# Altium footprint library con-samtec.PCBLIB: 805 footprints (part 34 of 55)
Each footprint in its own frame and in the unit in brackets; x right, y up, seen from the top. Pads: shape width x height; smd on the part's side, far side on the other; paste and mask are expansions set on the pad; w line width, h text height; cw(c..) or ccw(c..) is an arc to the next point about the centre after c.
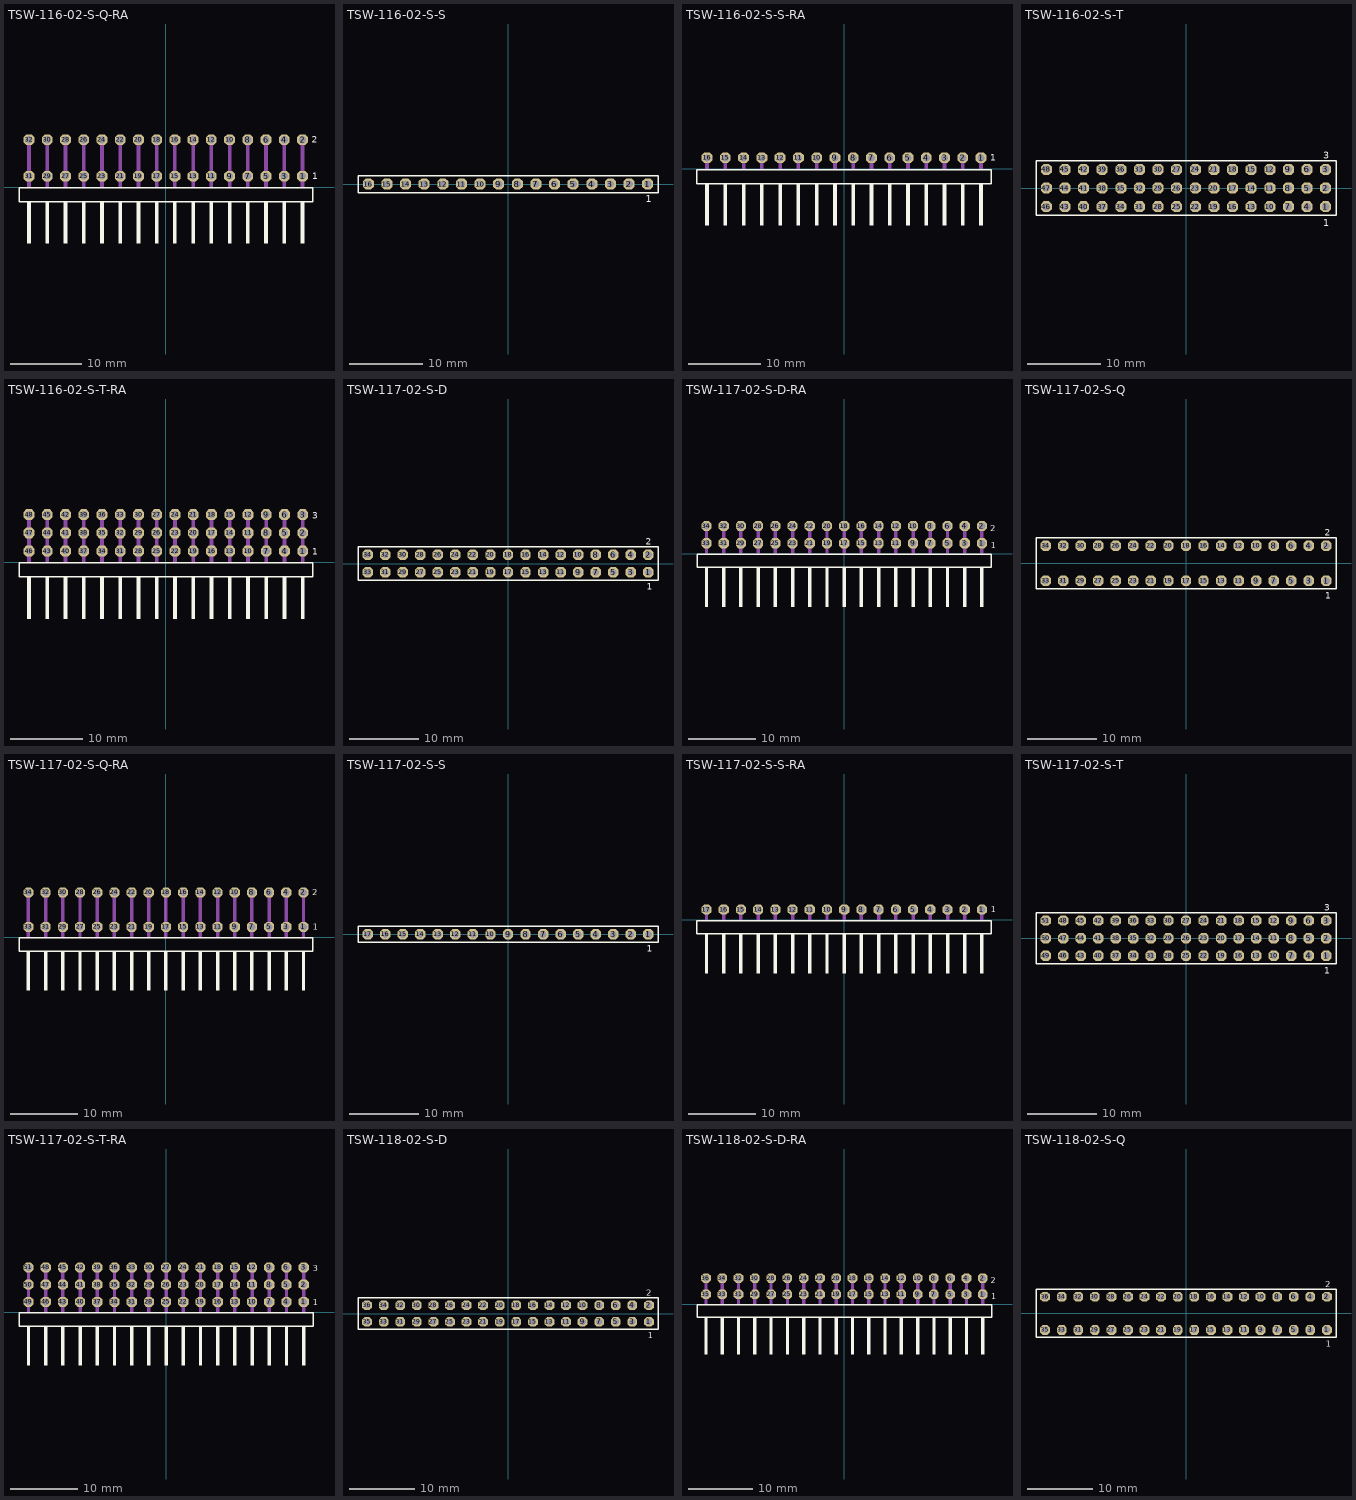
[diagram p33: the footprints below, top view; thin cyan lines are the x and y axes]

## TSW-116-02-S-Q-RA [mil]
pads (32):
  oct 59.06x59.06 hole 39.37: 1(750,60) 2(750,260) 3(650,60) 4(650,260) 5(550,60) 6(550,260) 7(450,60) 8(450,260) 9(350,60) 10(350,260) 11(250,60) 12(250,260) 13(150,60) 14(150,260) 15(50,60) 16(50,260) 17(-50,60) 18(-50,260) 19(-150,60) 20(-150,260) 21(-250,60) 22(-250,260) 23(-350,60) 24(-350,260) 25(-450,60) 26(-450,260) 27(-550,60) 28(-550,260) 29(-650,60) 30(-650,260) 31(-750,60) 32(-750,260)
Top Overlay:
  rectangle: -760,-310.63 -740,-80.32
  rectangle: -660,-310.63 -640,-80.32
  rectangle: -560,-310.63 -540,-80.32
  rectangle: -460,-310.63 -440,-80.32
  rectangle: -360,-310.63 -340,-80.32
  rectangle: -260,-310.63 -240,-80.32
  rectangle: -160,-310.63 -140,-80.32
  rectangle: -60,-310.63 -40,-80.32
  rectangle: 40,-310.63 60,-80.32
  rectangle: 140,-310.63 160,-80.32
  rectangle: 240,-310.63 260,-80.32
  rectangle: 340,-310.63 360,-80.32
  rectangle: 440,-310.63 460,-80.32
  rectangle: 540,-310.63 560,-80.32
  rectangle: 640,-310.63 660,-80.32
  rectangle: 740,-310.63 760,-80.32
  lines w8: -805.08,-80.55 805.08,-80.55 805.08,-4.17 -805.08,-4.17 -805.08,-80.55
  text "1" at 803.54,43.31 h36.81
  text "2" at 801.18,242.72 h36.81
Mechanical 16:
  rectangle: -760,0 -740,270
  rectangle: -660,0 -640,270
  rectangle: -560,0 -540,270
  rectangle: -460,0 -440,270
  rectangle: -360,0 -340,270
  rectangle: -260,0 -240,270
  rectangle: -160,0 -140,270
  rectangle: -60,0 -40,270
  rectangle: 40,0 60,270
  rectangle: 140,0 160,270
  rectangle: 240,0 260,270
  rectangle: 340,0 360,270
  rectangle: 440,0 460,270
  rectangle: 540,0 560,270
  rectangle: 640,0 660,270
  rectangle: 740,0 760,270

## TSW-116-02-S-S [mm]
pads (16):
  oct 1.5x1.5 hole 1: 1(19.05,0) 2(16.51,0) 3(13.97,0) 4(11.43,0) 5(8.89,0) 6(6.35,0) 7(3.81,0) 8(1.27,0) 9(-1.27,0) 10(-3.81,0) 11(-6.35,0) 12(-8.89,0) 13(-11.43,0) 14(-13.97,0) 15(-16.51,0) 16(-19.05,0)
Top Overlay:
  lines w0.203: -20.449,-1.155 20.449,-1.155 20.449,1.155 -20.449,1.155 -20.449,-1.155
  text "1" at 18.792,-2.498 h0.94
Mechanical 16:
  rectangle: -19.4,-0.35 -18.7,0.35
  rectangle: -16.86,-0.35 -16.16,0.35
  rectangle: -14.32,-0.35 -13.62,0.35
  rectangle: -11.78,-0.35 -11.08,0.35
  rectangle: -9.24,-0.35 -8.54,0.35
  rectangle: -6.7,-0.35 -6,0.35
  rectangle: -4.16,-0.35 -3.46,0.35
  rectangle: -1.62,-0.35 -0.92,0.35
  rectangle: 0.92,-0.35 1.62,0.35
  rectangle: 3.46,-0.35 4.16,0.35
  rectangle: 6,-0.35 6.7,0.35
  rectangle: 8.54,-0.35 9.24,0.35
  rectangle: 11.08,-0.35 11.78,0.35
  rectangle: 13.62,-0.35 14.32,0.35
  rectangle: 16.16,-0.35 16.86,0.35
  rectangle: 18.7,-0.35 19.4,0.35

## TSW-116-02-S-S-RA [mil]
pads (16):
  oct 59.06x59.06 hole 39.37: 1(750,60) 2(650,60) 3(550,60) 4(450,60) 5(350,60) 6(250,60) 7(150,60) 8(50,60) 9(-50,60) 10(-150,60) 11(-250,60) 12(-350,60) 13(-450,60) 14(-550,60) 15(-650,60) 16(-750,60)
Top Overlay:
  rectangle: -760,-310.63 -740,-80.32
  rectangle: -660,-310.63 -640,-80.32
  rectangle: -560,-310.63 -540,-80.32
  rectangle: -460,-310.63 -440,-80.32
  rectangle: -360,-310.63 -340,-80.32
  rectangle: -260,-310.63 -240,-80.32
  rectangle: -160,-310.63 -140,-80.32
  rectangle: -60,-310.63 -40,-80.32
  rectangle: 40,-310.63 60,-80.32
  rectangle: 140,-310.63 160,-80.32
  rectangle: 240,-310.63 260,-80.32
  rectangle: 340,-310.63 360,-80.32
  rectangle: 440,-310.63 460,-80.32
  rectangle: 540,-310.63 560,-80.32
  rectangle: 640,-310.63 660,-80.32
  rectangle: 740,-310.63 760,-80.32
  lines w8: -805.08,-80.55 805.08,-80.55 805.08,-4.17 -805.08,-4.17 -805.08,-80.55
  text "1" at 800.47,45.35 h36.81
Mechanical 16:
  rectangle: -760,0 -740,70
  rectangle: -660,0 -640,70
  rectangle: -560,0 -540,70
  rectangle: -460,0 -440,70
  rectangle: -360,0 -340,70
  rectangle: -260,0 -240,70
  rectangle: -160,0 -140,70
  rectangle: -60,0 -40,70
  rectangle: 40,0 60,70
  rectangle: 140,0 160,70
  rectangle: 240,0 260,70
  rectangle: 340,0 360,70
  rectangle: 440,0 460,70
  rectangle: 540,0 560,70
  rectangle: 640,0 660,70
  rectangle: 740,0 760,70

## TSW-116-02-S-T [mm]
pads (48):
  oct 1.5x1.5 hole 1: 1(19.05,-2.54) 2(19.05,0) 3(19.05,2.54) 4(16.51,-2.54) 5(16.51,0) 6(16.51,2.54) 7(13.97,-2.54) 8(13.97,0) 9(13.97,2.54) 10(11.43,-2.54) 11(11.43,0) 12(11.43,2.54) 13(8.89,-2.54) 14(8.89,0) 15(8.89,2.54) 16(6.35,-2.54) 17(6.35,0) 18(6.35,2.54) 19(3.81,-2.54) 20(3.81,0) 21(3.81,2.54) 22(1.27,-2.54) 23(1.27,0) 24(1.27,2.54) 25(-1.27,-2.54) 26(-1.27,0) 27(-1.27,2.54) 28(-3.81,-2.54) 29(-3.81,0) 30(-3.81,2.54) 31(-6.35,-2.54) 32(-6.35,0) 33(-6.35,2.54) 34(-8.89,-2.54) 35(-8.89,0) 36(-8.89,2.54) 37(-11.43,-2.54) 38(-11.43,0) 39(-11.43,2.54) 40(-13.97,-2.54) 41(-13.97,0) 42(-13.97,2.54) 43(-16.51,-2.54) 44(-16.51,0) 45(-16.51,2.54) 46(-19.05,-2.54) 47(-19.05,0) 48(-19.05,2.54)
Top Overlay:
  lines w0.203: -20.449,-3.695 20.449,-3.695 20.449,3.695 -20.449,3.695 -20.449,-3.695
  text "1" at 18.742,-5.188 h0.94
  text "3" at 18.738,3.989 h0.94
Mechanical 16:
  rectangle: -19.4,-2.89 -18.7,-2.19
  rectangle: -19.4,-0.35 -18.7,0.35
  rectangle: -19.4,2.19 -18.7,2.89
  rectangle: -16.86,-2.89 -16.16,-2.19
  rectangle: -16.86,-0.35 -16.16,0.35
  rectangle: -16.86,2.19 -16.16,2.89
  rectangle: -14.32,-2.89 -13.62,-2.19
  rectangle: -14.32,-0.35 -13.62,0.35
  rectangle: -14.32,2.19 -13.62,2.89
  rectangle: -11.78,-2.89 -11.08,-2.19
  rectangle: -11.78,-0.35 -11.08,0.35
  rectangle: -11.78,2.19 -11.08,2.89
  rectangle: -9.24,-2.89 -8.54,-2.19
  rectangle: -9.24,-0.35 -8.54,0.35
  rectangle: -9.24,2.19 -8.54,2.89
  rectangle: -6.7,-2.89 -6,-2.19
  rectangle: -6.7,-0.35 -6,0.35
  rectangle: -6.7,2.19 -6,2.89
  rectangle: -4.16,-2.89 -3.46,-2.19
  rectangle: -4.16,-0.35 -3.46,0.35
  rectangle: -4.16,2.19 -3.46,2.89
  rectangle: -1.62,-2.89 -0.92,-2.19
  rectangle: -1.62,-0.35 -0.92,0.35
  rectangle: -1.62,2.19 -0.92,2.89
  rectangle: 0.92,-2.89 1.62,-2.19
  rectangle: 0.92,-0.35 1.62,0.35
  rectangle: 0.92,2.19 1.62,2.89
  rectangle: 3.46,-2.89 4.16,-2.19
  rectangle: 3.46,-0.35 4.16,0.35
  rectangle: 3.46,2.19 4.16,2.89
  rectangle: 6,-2.89 6.7,-2.19
  rectangle: 6,-0.35 6.7,0.35
  rectangle: 6,2.19 6.7,2.89
  rectangle: 8.54,-2.89 9.24,-2.19
  rectangle: 8.54,-0.35 9.24,0.35
  rectangle: 8.54,2.19 9.24,2.89
  rectangle: 11.08,-2.89 11.78,-2.19
  rectangle: 11.08,-0.35 11.78,0.35
  rectangle: 11.08,2.19 11.78,2.89
  rectangle: 13.62,-2.89 14.32,-2.19
  rectangle: 13.62,-0.35 14.32,0.35
  rectangle: 13.62,2.19 14.32,2.89
  rectangle: 16.16,-2.89 16.86,-2.19
  rectangle: 16.16,-0.35 16.86,0.35
  rectangle: 16.16,2.19 16.86,2.89
  rectangle: 18.7,-2.89 19.4,-2.19
  rectangle: 18.7,-0.35 19.4,0.35
  rectangle: 18.7,2.19 19.4,2.89

## TSW-116-02-S-T-RA [mil]
pads (48):
  oct 59.06x59.06 hole 39.37: 1(750,60) 2(750,160) 3(750,260) 4(650,60) 5(650,160) 6(650,260) 7(550,60) 8(550,160) 9(550,260) 10(450,60) 11(450,160) 12(450,260) 13(350,60) 14(350,160) 15(350,260) 16(250,60) 17(250,160) 18(250,260) 19(150,60) 20(150,160) 21(150,260) 22(50,60) 23(50,160) 24(50,260) 25(-50,60) 26(-50,160) 27(-50,260) 28(-150,60) 29(-150,160) 30(-150,260) 31(-250,60) 32(-250,160) 33(-250,260) 34(-350,60) 35(-350,160) 36(-350,260) 37(-450,60) 38(-450,160) 39(-450,260) 40(-550,60) 41(-550,160) 42(-550,260) 43(-650,60) 44(-650,160) 45(-650,260) 46(-750,60) 47(-750,160) 48(-750,260)
Top Overlay:
  rectangle: -760,-310.63 -740,-80.32
  rectangle: -660,-310.63 -640,-80.32
  rectangle: -560,-310.63 -540,-80.32
  rectangle: -460,-310.63 -440,-80.32
  rectangle: -360,-310.63 -340,-80.32
  rectangle: -260,-310.63 -240,-80.32
  rectangle: -160,-310.63 -140,-80.32
  rectangle: -60,-310.63 -40,-80.32
  rectangle: 40,-310.63 60,-80.32
  rectangle: 140,-310.63 160,-80.32
  rectangle: 240,-310.63 260,-80.32
  rectangle: 340,-310.63 360,-80.32
  rectangle: 440,-310.63 460,-80.32
  rectangle: 540,-310.63 560,-80.32
  rectangle: 640,-310.63 660,-80.32
  rectangle: 740,-310.63 760,-80.32
  lines w8: -805.08,-80.55 805.08,-80.55 805.08,-4.17 -805.08,-4.17 -805.08,-80.55
  text "1" at 801.57,41.34 h36.81
  text "3" at 802.17,236.81 h36.81
Mechanical 16:
  rectangle: -760,0 -740,270
  rectangle: -660,0 -640,270
  rectangle: -560,0 -540,270
  rectangle: -460,0 -440,270
  rectangle: -360,0 -340,270
  rectangle: -260,0 -240,270
  rectangle: -160,0 -140,270
  rectangle: -60,0 -40,270
  rectangle: 40,0 60,270
  rectangle: 140,0 160,270
  rectangle: 240,0 260,270
  rectangle: 340,0 360,270
  rectangle: 440,0 460,270
  rectangle: 540,0 560,270
  rectangle: 640,0 660,270
  rectangle: 740,0 760,270

## TSW-117-02-S-D [mm]
pads (34):
  oct 1.5x1.5 hole 1: 1(20.32,-1.27) 2(20.32,1.27) 3(17.78,-1.27) 4(17.78,1.27) 5(15.24,-1.27) 6(15.24,1.27) 7(12.7,-1.27) 8(12.7,1.27) 9(10.16,-1.27) 10(10.16,1.27) 11(7.62,-1.27) 12(7.62,1.27) 13(5.08,-1.27) 14(5.08,1.27) 15(2.54,-1.27) 16(2.54,1.27) 17(0,-1.27) 18(0,1.27) 19(-2.54,-1.27) 20(-2.54,1.27) 21(-5.08,-1.27) 22(-5.08,1.27) 23(-7.62,-1.27) 24(-7.62,1.27) 25(-10.16,-1.27) 26(-10.16,1.27) 27(-12.7,-1.27) 28(-12.7,1.27) 29(-15.24,-1.27) 30(-15.24,1.27) 31(-17.78,-1.27) 32(-17.78,1.27) 33(-20.32,-1.27) 34(-20.32,1.27)
Top Overlay:
  lines w0.203: -21.719,-2.425 21.719,-2.425 21.719,2.425 -21.719,2.425 -21.719,-2.425
  text "1" at 20.112,-3.818 h0.94
  text "2" at 19.937,2.744 h0.94
Mechanical 16:
  rectangle: -20.67,-1.62 -19.97,-0.92
  rectangle: -20.67,0.92 -19.97,1.62
  rectangle: -18.13,-1.62 -17.43,-0.92
  rectangle: -18.13,0.92 -17.43,1.62
  rectangle: -15.59,-1.62 -14.89,-0.92
  rectangle: -15.59,0.92 -14.89,1.62
  rectangle: -13.05,-1.62 -12.35,-0.92
  rectangle: -13.05,0.92 -12.35,1.62
  rectangle: -10.51,-1.62 -9.81,-0.92
  rectangle: -10.51,0.92 -9.81,1.62
  rectangle: -7.97,-1.62 -7.27,-0.92
  rectangle: -7.97,0.92 -7.27,1.62
  rectangle: -5.43,-1.62 -4.73,-0.92
  rectangle: -5.43,0.92 -4.73,1.62
  rectangle: -2.89,-1.62 -2.19,-0.92
  rectangle: -2.89,0.92 -2.19,1.62
  rectangle: -0.35,-1.62 0.35,-0.92
  rectangle: -0.35,0.92 0.35,1.62
  rectangle: 2.19,-1.62 2.89,-0.92
  rectangle: 2.19,0.92 2.89,1.62
  rectangle: 4.73,-1.62 5.43,-0.92
  rectangle: 4.73,0.92 5.43,1.62
  rectangle: 7.27,-1.62 7.97,-0.92
  rectangle: 7.27,0.92 7.97,1.62
  rectangle: 9.81,-1.62 10.51,-0.92
  rectangle: 9.81,0.92 10.51,1.62
  rectangle: 12.35,-1.62 13.05,-0.92
  rectangle: 12.35,0.92 13.05,1.62
  rectangle: 14.89,-1.62 15.59,-0.92
  rectangle: 14.89,0.92 15.59,1.62
  rectangle: 17.43,-1.62 18.13,-0.92
  rectangle: 17.43,0.92 18.13,1.62
  rectangle: 19.97,-1.62 20.67,-0.92
  rectangle: 19.97,0.92 20.67,1.62

## TSW-117-02-S-D-RA [mil]
pads (34):
  oct 59.06x59.06 hole 39.37: 1(800,60) 2(800,160) 3(700,60) 4(700,160) 5(600,60) 6(600,160) 7(500,60) 8(500,160) 9(400,60) 10(400,160) 11(300,60) 12(300,160) 13(200,60) 14(200,160) 15(100,60) 16(100,160) 17(0,60) 18(0,160) 19(-100,60) 20(-100,160) 21(-200,60) 22(-200,160) 23(-300,60) 24(-300,160) 25(-400,60) 26(-400,160) 27(-500,60) 28(-500,160) 29(-600,60) 30(-600,160) 31(-700,60) 32(-700,160) 33(-800,60) 34(-800,160)
Top Overlay:
  rectangle: -810,-310.63 -790,-80.32
  rectangle: -710,-310.63 -690,-80.32
  rectangle: -610,-310.63 -590,-80.32
  rectangle: -510,-310.63 -490,-80.32
  rectangle: -410,-310.63 -390,-80.32
  rectangle: -310,-310.63 -290,-80.32
  rectangle: -210,-310.63 -190,-80.32
  rectangle: -110,-310.63 -90,-80.32
  rectangle: -10,-310.63 10,-80.32
  rectangle: 90,-310.63 110,-80.32
  rectangle: 190,-310.63 210,-80.32
  rectangle: 290,-310.63 310,-80.32
  rectangle: 390,-310.63 410,-80.32
  rectangle: 490,-310.63 510,-80.32
  rectangle: 590,-310.63 610,-80.32
  rectangle: 690,-310.63 710,-80.32
  rectangle: 790,-310.63 810,-80.32
  lines w8: -855.08,-80.55 855.08,-80.55 855.08,-4.17 -855.08,-4.17 -855.08,-80.55
  text "1" at 850.59,30.51 h36.81
  text "2" at 849.21,129.53 h36.81
Mechanical 16:
  rectangle: -810,0 -790,170
  rectangle: -710,0 -690,170
  rectangle: -610,0 -590,170
  rectangle: -510,0 -490,170
  rectangle: -410,0 -390,170
  rectangle: -310,0 -290,170
  rectangle: -210,0 -190,170
  rectangle: -110,0 -90,170
  rectangle: -10,0 10,170
  rectangle: 90,0 110,170
  rectangle: 190,0 210,170
  rectangle: 290,0 310,170
  rectangle: 390,0 410,170
  rectangle: 490,0 510,170
  rectangle: 590,0 610,170
  rectangle: 690,0 710,170
  rectangle: 790,0 810,170

## TSW-117-02-S-Q [mm]
pads (34):
  oct 1.5x1.5 hole 1: 1(20.32,-2.54) 2(20.32,2.54) 3(17.78,-2.54) 4(17.78,2.54) 5(15.24,-2.54) 6(15.24,2.54) 7(12.7,-2.54) 8(12.7,2.54) 9(10.16,-2.54) 10(10.16,2.54) 11(7.62,-2.54) 12(7.62,2.54) 13(5.08,-2.54) 14(5.08,2.54) 15(2.54,-2.54) 16(2.54,2.54) 17(0,-2.54) 18(0,2.54) 19(-2.54,-2.54) 20(-2.54,2.54) 21(-5.08,-2.54) 22(-5.08,2.54) 23(-7.62,-2.54) 24(-7.62,2.54) 25(-10.16,-2.54) 26(-10.16,2.54) 27(-12.7,-2.54) 28(-12.7,2.54) 29(-15.24,-2.54) 30(-15.24,2.54) 31(-17.78,-2.54) 32(-17.78,2.54) 33(-20.32,-2.54) 34(-20.32,2.54)
Top Overlay:
  lines w0.203: -21.719,-3.695 21.719,-3.695 21.719,3.695 -21.719,3.695 -21.719,-3.695
  text "1" at 20.162,-5.138 h0.94
  text "2" at 20.062,3.989 h0.94
Mechanical 16:
  rectangle: -20.67,-2.89 -19.97,-2.19
  rectangle: -20.67,2.19 -19.97,2.89
  rectangle: -18.13,-2.89 -17.43,-2.19
  rectangle: -18.13,2.19 -17.43,2.89
  rectangle: -15.59,-2.89 -14.89,-2.19
  rectangle: -15.59,2.19 -14.89,2.89
  rectangle: -13.05,-2.89 -12.35,-2.19
  rectangle: -13.05,2.19 -12.35,2.89
  rectangle: -10.51,-2.89 -9.81,-2.19
  rectangle: -10.51,2.19 -9.81,2.89
  rectangle: -7.97,-2.89 -7.27,-2.19
  rectangle: -7.97,2.19 -7.27,2.89
  rectangle: -5.43,-2.89 -4.73,-2.19
  rectangle: -5.43,2.19 -4.73,2.89
  rectangle: -2.89,-2.89 -2.19,-2.19
  rectangle: -2.89,2.19 -2.19,2.89
  rectangle: -0.35,-2.89 0.35,-2.19
  rectangle: -0.35,2.19 0.35,2.89
  rectangle: 2.19,-2.89 2.89,-2.19
  rectangle: 2.19,2.19 2.89,2.89
  rectangle: 4.73,-2.89 5.43,-2.19
  rectangle: 4.73,2.19 5.43,2.89
  rectangle: 7.27,-2.89 7.97,-2.19
  rectangle: 7.27,2.19 7.97,2.89
  rectangle: 9.81,-2.89 10.51,-2.19
  rectangle: 9.81,2.19 10.51,2.89
  rectangle: 12.35,-2.89 13.05,-2.19
  rectangle: 12.35,2.19 13.05,2.89
  rectangle: 14.89,-2.89 15.59,-2.19
  rectangle: 14.89,2.19 15.59,2.89
  rectangle: 17.43,-2.89 18.13,-2.19
  rectangle: 17.43,2.19 18.13,2.89
  rectangle: 19.97,-2.89 20.67,-2.19
  rectangle: 19.97,2.19 20.67,2.89

## TSW-117-02-S-Q-RA [mil]
pads (34):
  oct 59.06x59.06 hole 39.37: 1(800,60) 2(800,260) 3(700,60) 4(700,260) 5(600,60) 6(600,260) 7(500,60) 8(500,260) 9(400,60) 10(400,260) 11(300,60) 12(300,260) 13(200,60) 14(200,260) 15(100,60) 16(100,260) 17(0,60) 18(0,260) 19(-100,60) 20(-100,260) 21(-200,60) 22(-200,260) 23(-300,60) 24(-300,260) 25(-400,60) 26(-400,260) 27(-500,60) 28(-500,260) 29(-600,60) 30(-600,260) 31(-700,60) 32(-700,260) 33(-800,60) 34(-800,260)
Top Overlay:
  rectangle: -810,-310.63 -790,-80.32
  rectangle: -710,-310.63 -690,-80.32
  rectangle: -610,-310.63 -590,-80.32
  rectangle: -510,-310.63 -490,-80.32
  rectangle: -410,-310.63 -390,-80.32
  rectangle: -310,-310.63 -290,-80.32
  rectangle: -210,-310.63 -190,-80.32
  rectangle: -110,-310.63 -90,-80.32
  rectangle: -10,-310.63 10,-80.32
  rectangle: 90,-310.63 110,-80.32
  rectangle: 190,-310.63 210,-80.32
  rectangle: 290,-310.63 310,-80.32
  rectangle: 390,-310.63 410,-80.32
  rectangle: 490,-310.63 510,-80.32
  rectangle: 590,-310.63 610,-80.32
  rectangle: 690,-310.63 710,-80.32
  rectangle: 790,-310.63 810,-80.32
  lines w8: -855.08,-80.55 855.08,-80.55 855.08,-4.17 -855.08,-4.17 -855.08,-80.55
  text "1" at 853.54,43.31 h36.81
  text "2" at 851.18,242.72 h36.81
Mechanical 16:
  rectangle: -810,0 -790,270
  rectangle: -710,0 -690,270
  rectangle: -610,0 -590,270
  rectangle: -510,0 -490,270
  rectangle: -410,0 -390,270
  rectangle: -310,0 -290,270
  rectangle: -210,0 -190,270
  rectangle: -110,0 -90,270
  rectangle: -10,0 10,270
  rectangle: 90,0 110,270
  rectangle: 190,0 210,270
  rectangle: 290,0 310,270
  rectangle: 390,0 410,270
  rectangle: 490,0 510,270
  rectangle: 590,0 610,270
  rectangle: 690,0 710,270
  rectangle: 790,0 810,270

## TSW-117-02-S-S [mm]
pads (17):
  oct 1.5x1.5 hole 1: 1(20.32,0) 2(17.78,0) 3(15.24,0) 4(12.7,0) 5(10.16,0) 6(7.62,0) 7(5.08,0) 8(2.54,0) 9(0,0) 10(-2.54,0) 11(-5.08,0) 12(-7.62,0) 13(-10.16,0) 14(-12.7,0) 15(-15.24,0) 16(-17.78,0) 17(-20.32,0)
Top Overlay:
  lines w0.203: -21.719,-1.155 21.719,-1.155 21.719,1.155 -21.719,1.155 -21.719,-1.155
  text "1" at 20.062,-2.498 h0.94
Mechanical 16:
  rectangle: -20.67,-0.35 -19.97,0.35
  rectangle: -18.13,-0.35 -17.43,0.35
  rectangle: -15.59,-0.35 -14.89,0.35
  rectangle: -13.05,-0.35 -12.35,0.35
  rectangle: -10.51,-0.35 -9.81,0.35
  rectangle: -7.97,-0.35 -7.27,0.35
  rectangle: -5.43,-0.35 -4.73,0.35
  rectangle: -2.89,-0.35 -2.19,0.35
  rectangle: -0.35,-0.35 0.35,0.35
  rectangle: 2.19,-0.35 2.89,0.35
  rectangle: 4.73,-0.35 5.43,0.35
  rectangle: 7.27,-0.35 7.97,0.35
  rectangle: 9.81,-0.35 10.51,0.35
  rectangle: 12.35,-0.35 13.05,0.35
  rectangle: 14.89,-0.35 15.59,0.35
  rectangle: 17.43,-0.35 18.13,0.35
  rectangle: 19.97,-0.35 20.67,0.35

## TSW-117-02-S-S-RA [mil]
pads (17):
  oct 59.06x59.06 hole 39.37: 1(800,60) 2(700,60) 3(600,60) 4(500,60) 5(400,60) 6(300,60) 7(200,60) 8(100,60) 9(0,60) 10(-100,60) 11(-200,60) 12(-300,60) 13(-400,60) 14(-500,60) 15(-600,60) 16(-700,60) 17(-800,60)
Top Overlay:
  rectangle: -810,-310.63 -790,-80.32
  rectangle: -710,-310.63 -690,-80.32
  rectangle: -610,-310.63 -590,-80.32
  rectangle: -510,-310.63 -490,-80.32
  rectangle: -410,-310.63 -390,-80.32
  rectangle: -310,-310.63 -290,-80.32
  rectangle: -210,-310.63 -190,-80.32
  rectangle: -110,-310.63 -90,-80.32
  rectangle: -10,-310.63 10,-80.32
  rectangle: 90,-310.63 110,-80.32
  rectangle: 190,-310.63 210,-80.32
  rectangle: 290,-310.63 310,-80.32
  rectangle: 390,-310.63 410,-80.32
  rectangle: 490,-310.63 510,-80.32
  rectangle: 590,-310.63 610,-80.32
  rectangle: 690,-310.63 710,-80.32
  rectangle: 790,-310.63 810,-80.32
  lines w8: -855.08,-80.55 855.08,-80.55 855.08,-4.17 -855.08,-4.17 -855.08,-80.55
  text "1" at 850.47,45.35 h36.81
Mechanical 16:
  rectangle: -810,0 -790,70
  rectangle: -710,0 -690,70
  rectangle: -610,0 -590,70
  rectangle: -510,0 -490,70
  rectangle: -410,0 -390,70
  rectangle: -310,0 -290,70
  rectangle: -210,0 -190,70
  rectangle: -110,0 -90,70
  rectangle: -10,0 10,70
  rectangle: 90,0 110,70
  rectangle: 190,0 210,70
  rectangle: 290,0 310,70
  rectangle: 390,0 410,70
  rectangle: 490,0 510,70
  rectangle: 590,0 610,70
  rectangle: 690,0 710,70
  rectangle: 790,0 810,70

## TSW-117-02-S-T [mm]
pads (51):
  oct 1.5x1.5 hole 1: 1(20.32,-2.54) 2(20.32,0) 3(20.32,2.54) 4(17.78,-2.54) 5(17.78,0) 6(17.78,2.54) 7(15.24,-2.54) 8(15.24,0) 9(15.24,2.54) 10(12.7,-2.54) 11(12.7,0) 12(12.7,2.54) 13(10.16,-2.54) 14(10.16,0) 15(10.16,2.54) 16(7.62,-2.54) 17(7.62,0) 18(7.62,2.54) 19(5.08,-2.54) 20(5.08,0) 21(5.08,2.54) 22(2.54,-2.54) 23(2.54,0) 24(2.54,2.54) 25(0,-2.54) 26(0,0) 27(0,2.54) 28(-2.54,-2.54) 29(-2.54,0) 30(-2.54,2.54) 31(-5.08,-2.54) 32(-5.08,0) 33(-5.08,2.54) 34(-7.62,-2.54) 35(-7.62,0) 36(-7.62,2.54) 37(-10.16,-2.54) 38(-10.16,0) 39(-10.16,2.54) 40(-12.7,-2.54) 41(-12.7,0) 42(-12.7,2.54) 43(-15.24,-2.54) 44(-15.24,0) 45(-15.24,2.54) 46(-17.78,-2.54) 47(-17.78,0) 48(-17.78,2.54) 49(-20.32,-2.54) 50(-20.32,0) 51(-20.32,2.54)
Top Overlay:
  lines w0.203: -21.719,-3.695 21.719,-3.695 21.719,3.695 -21.719,3.695 -21.719,-3.695
  text "1" at 20.012,-5.188 h0.94
  text "3" at 20.008,3.989 h0.94
Mechanical 16:
  rectangle: -20.67,-2.89 -19.97,-2.19
  rectangle: -20.67,-0.35 -19.97,0.35
  rectangle: -20.67,2.19 -19.97,2.89
  rectangle: -18.13,-2.89 -17.43,-2.19
  rectangle: -18.13,-0.35 -17.43,0.35
  rectangle: -18.13,2.19 -17.43,2.89
  rectangle: -15.59,-2.89 -14.89,-2.19
  rectangle: -15.59,-0.35 -14.89,0.35
  rectangle: -15.59,2.19 -14.89,2.89
  rectangle: -13.05,-2.89 -12.35,-2.19
  rectangle: -13.05,-0.35 -12.35,0.35
  rectangle: -13.05,2.19 -12.35,2.89
  rectangle: -10.51,-2.89 -9.81,-2.19
  rectangle: -10.51,-0.35 -9.81,0.35
  rectangle: -10.51,2.19 -9.81,2.89
  rectangle: -7.97,-2.89 -7.27,-2.19
  rectangle: -7.97,-0.35 -7.27,0.35
  rectangle: -7.97,2.19 -7.27,2.89
  rectangle: -5.43,-2.89 -4.73,-2.19
  rectangle: -5.43,-0.35 -4.73,0.35
  rectangle: -5.43,2.19 -4.73,2.89
  rectangle: -2.89,-2.89 -2.19,-2.19
  rectangle: -2.89,-0.35 -2.19,0.35
  rectangle: -2.89,2.19 -2.19,2.89
  rectangle: -0.35,-2.89 0.35,-2.19
  rectangle: -0.35,-0.35 0.35,0.35
  rectangle: -0.35,2.19 0.35,2.89
  rectangle: 2.19,-2.89 2.89,-2.19
  rectangle: 2.19,-0.35 2.89,0.35
  rectangle: 2.19,2.19 2.89,2.89
  rectangle: 4.73,-2.89 5.43,-2.19
  rectangle: 4.73,-0.35 5.43,0.35
  rectangle: 4.73,2.19 5.43,2.89
  rectangle: 7.27,-2.89 7.97,-2.19
  rectangle: 7.27,-0.35 7.97,0.35
  rectangle: 7.27,2.19 7.97,2.89
  rectangle: 9.81,-2.89 10.51,-2.19
  rectangle: 9.81,-0.35 10.51,0.35
  rectangle: 9.81,2.19 10.51,2.89
  rectangle: 12.35,-2.89 13.05,-2.19
  rectangle: 12.35,-0.35 13.05,0.35
  rectangle: 12.35,2.19 13.05,2.89
  rectangle: 14.89,-2.89 15.59,-2.19
  rectangle: 14.89,-0.35 15.59,0.35
  rectangle: 14.89,2.19 15.59,2.89
  rectangle: 17.43,-2.89 18.13,-2.19
  rectangle: 17.43,-0.35 18.13,0.35
  rectangle: 17.43,2.19 18.13,2.89
  rectangle: 19.97,-2.89 20.67,-2.19
  rectangle: 19.97,-0.35 20.67,0.35
  rectangle: 19.97,2.19 20.67,2.89

## TSW-117-02-S-T-RA [mil]
pads (51):
  oct 59.06x59.06 hole 39.37: 1(800,60) 2(800,160) 3(800,260) 4(700,60) 5(700,160) 6(700,260) 7(600,60) 8(600,160) 9(600,260) 10(500,60) 11(500,160) 12(500,260) 13(400,60) 14(400,160) 15(400,260) 16(300,60) 17(300,160) 18(300,260) 19(200,60) 20(200,160) 21(200,260) 22(100,60) 23(100,160) 24(100,260) 25(0,60) 26(0,160) 27(0,260) 28(-100,60) 29(-100,160) 30(-100,260) 31(-200,60) 32(-200,160) 33(-200,260) 34(-300,60) 35(-300,160) 36(-300,260) 37(-400,60) 38(-400,160) 39(-400,260) 40(-500,60) 41(-500,160) 42(-500,260) 43(-600,60) 44(-600,160) 45(-600,260) 46(-700,60) 47(-700,160) 48(-700,260) 49(-800,60) 50(-800,160) 51(-800,260)
Top Overlay:
  rectangle: -810,-310.63 -790,-80.32
  rectangle: -710,-310.63 -690,-80.32
  rectangle: -610,-310.63 -590,-80.32
  rectangle: -510,-310.63 -490,-80.32
  rectangle: -410,-310.63 -390,-80.32
  rectangle: -310,-310.63 -290,-80.32
  rectangle: -210,-310.63 -190,-80.32
  rectangle: -110,-310.63 -90,-80.32
  rectangle: -10,-310.63 10,-80.32
  rectangle: 90,-310.63 110,-80.32
  rectangle: 190,-310.63 210,-80.32
  rectangle: 290,-310.63 310,-80.32
  rectangle: 390,-310.63 410,-80.32
  rectangle: 490,-310.63 510,-80.32
  rectangle: 590,-310.63 610,-80.32
  rectangle: 690,-310.63 710,-80.32
  rectangle: 790,-310.63 810,-80.32
  lines w8: -855.08,-80.55 855.08,-80.55 855.08,-4.17 -855.08,-4.17 -855.08,-80.55
  text "1" at 851.57,41.34 h36.81
  text "3" at 852.17,236.81 h36.81
Mechanical 16:
  rectangle: -810,0 -790,270
  rectangle: -710,0 -690,270
  rectangle: -610,0 -590,270
  rectangle: -510,0 -490,270
  rectangle: -410,0 -390,270
  rectangle: -310,0 -290,270
  rectangle: -210,0 -190,270
  rectangle: -110,0 -90,270
  rectangle: -10,0 10,270
  rectangle: 90,0 110,270
  rectangle: 190,0 210,270
  rectangle: 290,0 310,270
  rectangle: 390,0 410,270
  rectangle: 490,0 510,270
  rectangle: 590,0 610,270
  rectangle: 690,0 710,270
  rectangle: 790,0 810,270

## TSW-118-02-S-D [mm]
pads (36):
  oct 1.5x1.5 hole 1: 1(21.59,-1.27) 2(21.59,1.27) 3(19.05,-1.27) 4(19.05,1.27) 5(16.51,-1.27) 6(16.51,1.27) 7(13.97,-1.27) 8(13.97,1.27) 9(11.43,-1.27) 10(11.43,1.27) 11(8.89,-1.27) 12(8.89,1.27) 13(6.35,-1.27) 14(6.35,1.27) 15(3.81,-1.27) 16(3.81,1.27) 17(1.27,-1.27) 18(1.27,1.27) 19(-1.27,-1.27) 20(-1.27,1.27) 21(-3.81,-1.27) 22(-3.81,1.27) 23(-6.35,-1.27) 24(-6.35,1.27) 25(-8.89,-1.27) 26(-8.89,1.27) 27(-11.43,-1.27) 28(-11.43,1.27) 29(-13.97,-1.27) 30(-13.97,1.27) 31(-16.51,-1.27) 32(-16.51,1.27) 33(-19.05,-1.27) 34(-19.05,1.27) 35(-21.59,-1.27) 36(-21.59,1.27)
Top Overlay:
  lines w0.203: -22.989,-2.425 22.989,-2.425 22.989,2.425 -22.989,2.425 -22.989,-2.425
  text "1" at 21.382,-3.818 h0.94
  text "2" at 21.207,2.744 h0.94
Mechanical 16:
  rectangle: -21.94,-1.62 -21.24,-0.92
  rectangle: -21.94,0.92 -21.24,1.62
  rectangle: -19.4,-1.62 -18.7,-0.92
  rectangle: -19.4,0.92 -18.7,1.62
  rectangle: -16.86,-1.62 -16.16,-0.92
  rectangle: -16.86,0.92 -16.16,1.62
  rectangle: -14.32,-1.62 -13.62,-0.92
  rectangle: -14.32,0.92 -13.62,1.62
  rectangle: -11.78,-1.62 -11.08,-0.92
  rectangle: -11.78,0.92 -11.08,1.62
  rectangle: -9.24,-1.62 -8.54,-0.92
  rectangle: -9.24,0.92 -8.54,1.62
  rectangle: -6.7,-1.62 -6,-0.92
  rectangle: -6.7,0.92 -6,1.62
  rectangle: -4.16,-1.62 -3.46,-0.92
  rectangle: -4.16,0.92 -3.46,1.62
  rectangle: -1.62,-1.62 -0.92,-0.92
  rectangle: -1.62,0.92 -0.92,1.62
  rectangle: 0.92,-1.62 1.62,-0.92
  rectangle: 0.92,0.92 1.62,1.62
  rectangle: 3.46,-1.62 4.16,-0.92
  rectangle: 3.46,0.92 4.16,1.62
  rectangle: 6,-1.62 6.7,-0.92
  rectangle: 6,0.92 6.7,1.62
  rectangle: 8.54,-1.62 9.24,-0.92
  rectangle: 8.54,0.92 9.24,1.62
  rectangle: 11.08,-1.62 11.78,-0.92
  rectangle: 11.08,0.92 11.78,1.62
  rectangle: 13.62,-1.62 14.32,-0.92
  rectangle: 13.62,0.92 14.32,1.62
  rectangle: 16.16,-1.62 16.86,-0.92
  rectangle: 16.16,0.92 16.86,1.62
  rectangle: 18.7,-1.62 19.4,-0.92
  rectangle: 18.7,0.92 19.4,1.62
  rectangle: 21.24,-1.62 21.94,-0.92
  rectangle: 21.24,0.92 21.94,1.62

## TSW-118-02-S-D-RA [mil]
pads (36):
  oct 59.06x59.06 hole 39.37: 1(850,60) 2(850,160) 3(750,60) 4(750,160) 5(650,60) 6(650,160) 7(550,60) 8(550,160) 9(450,60) 10(450,160) 11(350,60) 12(350,160) 13(250,60) 14(250,160) 15(150,60) 16(150,160) 17(50,60) 18(50,160) 19(-50,60) 20(-50,160) 21(-150,60) 22(-150,160) 23(-250,60) 24(-250,160) 25(-350,60) 26(-350,160) 27(-450,60) 28(-450,160) 29(-550,60) 30(-550,160) 31(-650,60) 32(-650,160) 33(-750,60) 34(-750,160) 35(-850,60) 36(-850,160)
Top Overlay:
  rectangle: -860,-310.63 -840,-80.32
  rectangle: -760,-310.63 -740,-80.32
  rectangle: -660,-310.63 -640,-80.32
  rectangle: -560,-310.63 -540,-80.32
  rectangle: -460,-310.63 -440,-80.32
  rectangle: -360,-310.63 -340,-80.32
  rectangle: -260,-310.63 -240,-80.32
  rectangle: -160,-310.63 -140,-80.32
  rectangle: -60,-310.63 -40,-80.32
  rectangle: 40,-310.63 60,-80.32
  rectangle: 140,-310.63 160,-80.32
  rectangle: 240,-310.63 260,-80.32
  rectangle: 340,-310.63 360,-80.32
  rectangle: 440,-310.63 460,-80.32
  rectangle: 540,-310.63 560,-80.32
  rectangle: 640,-310.63 660,-80.32
  rectangle: 740,-310.63 760,-80.32
  rectangle: 840,-310.63 860,-80.32
  lines w8: -905.08,-80.55 905.08,-80.55 905.08,-4.17 -905.08,-4.17 -905.08,-80.55
  text "1" at 900.59,30.51 h36.81
  text "2" at 899.21,129.53 h36.81
Mechanical 16:
  rectangle: -860,0 -840,170
  rectangle: -760,0 -740,170
  rectangle: -660,0 -640,170
  rectangle: -560,0 -540,170
  rectangle: -460,0 -440,170
  rectangle: -360,0 -340,170
  rectangle: -260,0 -240,170
  rectangle: -160,0 -140,170
  rectangle: -60,0 -40,170
  rectangle: 40,0 60,170
  rectangle: 140,0 160,170
  rectangle: 240,0 260,170
  rectangle: 340,0 360,170
  rectangle: 440,0 460,170
  rectangle: 540,0 560,170
  rectangle: 640,0 660,170
  rectangle: 740,0 760,170
  rectangle: 840,0 860,170

## TSW-118-02-S-Q [mm]
pads (36):
  oct 1.5x1.5 hole 1: 1(21.59,-2.54) 2(21.59,2.54) 3(19.05,-2.54) 4(19.05,2.54) 5(16.51,-2.54) 6(16.51,2.54) 7(13.97,-2.54) 8(13.97,2.54) 9(11.43,-2.54) 10(11.43,2.54) 11(8.89,-2.54) 12(8.89,2.54) 13(6.35,-2.54) 14(6.35,2.54) 15(3.81,-2.54) 16(3.81,2.54) 17(1.27,-2.54) 18(1.27,2.54) 19(-1.27,-2.54) 20(-1.27,2.54) 21(-3.81,-2.54) 22(-3.81,2.54) 23(-6.35,-2.54) 24(-6.35,2.54) 25(-8.89,-2.54) 26(-8.89,2.54) 27(-11.43,-2.54) 28(-11.43,2.54) 29(-13.97,-2.54) 30(-13.97,2.54) 31(-16.51,-2.54) 32(-16.51,2.54) 33(-19.05,-2.54) 34(-19.05,2.54) 35(-21.59,-2.54) 36(-21.59,2.54)
Top Overlay:
  lines w0.203: -22.989,-3.695 22.989,-3.695 22.989,3.695 -22.989,3.695 -22.989,-3.695
  text "1" at 21.432,-5.138 h0.94
  text "2" at 21.332,3.989 h0.94
Mechanical 16:
  rectangle: -21.94,-2.89 -21.24,-2.19
  rectangle: -21.94,2.19 -21.24,2.89
  rectangle: -19.4,-2.89 -18.7,-2.19
  rectangle: -19.4,2.19 -18.7,2.89
  rectangle: -16.86,-2.89 -16.16,-2.19
  rectangle: -16.86,2.19 -16.16,2.89
  rectangle: -14.32,-2.89 -13.62,-2.19
  rectangle: -14.32,2.19 -13.62,2.89
  rectangle: -11.78,-2.89 -11.08,-2.19
  rectangle: -11.78,2.19 -11.08,2.89
  rectangle: -9.24,-2.89 -8.54,-2.19
  rectangle: -9.24,2.19 -8.54,2.89
  rectangle: -6.7,-2.89 -6,-2.19
  rectangle: -6.7,2.19 -6,2.89
  rectangle: -4.16,-2.89 -3.46,-2.19
  rectangle: -4.16,2.19 -3.46,2.89
  rectangle: -1.62,-2.89 -0.92,-2.19
  rectangle: -1.62,2.19 -0.92,2.89
  rectangle: 0.92,-2.89 1.62,-2.19
  rectangle: 0.92,2.19 1.62,2.89
  rectangle: 3.46,-2.89 4.16,-2.19
  rectangle: 3.46,2.19 4.16,2.89
  rectangle: 6,-2.89 6.7,-2.19
  rectangle: 6,2.19 6.7,2.89
  rectangle: 8.54,-2.89 9.24,-2.19
  rectangle: 8.54,2.19 9.24,2.89
  rectangle: 11.08,-2.89 11.78,-2.19
  rectangle: 11.08,2.19 11.78,2.89
  rectangle: 13.62,-2.89 14.32,-2.19
  rectangle: 13.62,2.19 14.32,2.89
  rectangle: 16.16,-2.89 16.86,-2.19
  rectangle: 16.16,2.19 16.86,2.89
  rectangle: 18.7,-2.89 19.4,-2.19
  rectangle: 18.7,2.19 19.4,2.89
  rectangle: 21.24,-2.89 21.94,-2.19
  rectangle: 21.24,2.19 21.94,2.89